# Altium schematic symbol library AD_Lib.SchLib: 1239 symbols (part 7 of 9) (continued)
## R0805_5.11K/150V@2
designator R?, comment 5.11k¦¸,0.125W
ÌùÆ¬µç×è; Manufacturer: Panasonic; pro-environment: RoHS; Quality: -55~155¡æ; other: 5.11k¦¸,0.125W,1%,150V; OPN: ERJ-6ENF5111V; PadsNum: 2; SN: SN; Category: µç×è; Part: ERJ-6ENF5111V; Value: 5.11k¦¸,0.125W; Price: ?; OPN_JLC: OPN_JLC; SN_JLC: SN_JLC; Price_JLC: 0
footprint R0805 (ÌùÆ¬µç×è£¬¹¦ÂÊ1/8W)
pins: 1, 2

## R0805_6.8K/150V
designator R?, comment 6.8k¦¸,0.125W
ÌùÆ¬µç×è; Manufacturer: KOA; pro-environment: RoHS; Quality: -55~155¡æ; other: 6.8k¦¸,0.125W,1%,150V; OPN: RK73H2ATTD6801F; PadsNum: 2; SN: SN; Category: µç×è; Part: RK73H2ATTD6801F; Value: 6.8k¦¸,0.125W; Price: ?; OPN_JLC: 0805W8F6801T5E; SN_JLC: C17772; Price_JLC: 0
footprint R0805 (ÌùÆ¬µç×è£¬¹¦ÂÊ1/8W)
pins: 1, 2

## R0805_7.5K/150V
designator R?, comment 7.5k¦¸,0.125W
ÌùÆ¬µç×è; Manufacturer: KOA; pro-environment: RoHS; Quality: -55~155¡æ; other: 7.5k¦¸,0.25W,1%,150V; OPN: RK73H2ATTD7501F; PadsNum: 2; SN: SN; Category: µç×è; Part: RK73H2ATTD7501F; Value: 7.5k¦¸,0.125W; QTY: 5000; Price: 0.04212; OPN_JLC: 0805W8F7501T5E; SN_JLC: C17807; Price_JLC: 0
footprint R0805 (ÌùÆ¬µç×è£¬¹¦ÂÊ1/8W)
pins: 1, 2

## R0805_8.2K/150V
designator R?, comment 8.2k¦¸,0.125W
ÌùÆ¬µç×è; Manufacturer: KOA; pro-environment: RoHS; Quality: -55~155¡æ; other: 8.2k¦¸,0.125W,1%,150V; OPN: RK73H2ATTD8201F; PadsNum: 2; SN: SN; Category: µç×è; Part: RK73H2ATTD8201F; Value: 8.2k¦¸,0.125W; QTY: 5000; Price: ?; OPN_JLC: 0805W8F8201T5E; SN_JLC: C17828; Price_JLC: 0
footprint R0805 (ÌùÆ¬µç×è£¬¹¦ÂÊ1/8W)
pins: 1, 2

## R0805_10/150V
designator R?, comment 10¦¸,0.125W
ÌùÆ¬µç×è; Manufacturer: KOA; pro-environment: RoHS; Quality: -55~155¡æ; SN: 03.4.38.11.17010001S; other: 10¦¸,0.125W,1%,150V; OPN: RK73H2ATTD10R0F; PadsNum: 2; Category: µç×è; Part: RK73H2ATTD10R0F; Value: 10¦¸,0.125W; QTY: 5000; Price: 0.03393; OPN_JLC: 0805W8F100JT5E; SN_JLC: C17415; Price_JLC: 0
footprint R0805 (ÌùÆ¬µç×è£¬¹¦ÂÊ1/8W)
pins: 1, 2

## R0805_10K/150V
designator R?, comment 10k¦¸,0.125W
ÌùÆ¬µç×è; Manufacturer: KOA; pro-environment: RoHS; Quality: -55~155¡æ; other: 10k¦¸,0.125W,1%,150V; OPN: RK73H2ATTD1002F; PadsNum: 2; SN: SN; Category: µç×è; Part: RK73H2ATTD1002F; Value: 10k¦¸,0.125W; Price: ?; OPN_JLC: 0805W8F1002T5E; SN_JLC: C17414; Price_JLC: 0
footprint R0805 (ÌùÆ¬µç×è£¬¹¦ÂÊ1/8W)
pins: 1, 2

## R0805_10K/150V@2
designator R?, comment 10k¦¸,0.125W
ÌùÆ¬µç×è; Manufacturer: Panasonic; pro-environment: RoHS; Quality: -55~155¡æ; other: 10k¦¸,0.125W,1%,150V; OPN: ERJ-6ENF1002V; PadsNum: 2; SN: SN; Category: µç×è; Part: ERJ-6ENF1002V; Value: 10k¦¸,0.125W; Price: ?; OPN_JLC: 0805W8F1002T5E; SN_JLC: C17414; Price_JLC: 0
footprint R0805 (ÌùÆ¬µç×è£¬¹¦ÂÊ1/8W)
pins: 1, 2

## R0805_12.7k/150V@3
designator R?, comment 12.7k¦¸,0.125W
ÌùÆ¬µç×è; Manufacturer: Viking; pro-environment: RoHS; Quality: -55~155¡æ; other: 12.7k¦¸,0.125W,1%,150V; OPN: ARG05FTC1272N; PadsNum: 2; SN: SN; Category: µç×è; Part: ARG05FTC1272N; Value: 12.7k¦¸,0.125W; QTY: 5000; Price: 0.035102; OPN_JLC: ARG05FTC1272N; SN_JLC: C217802; Price_JLC: 0.035102
footprint R0805 (ÌùÆ¬µç×è£¬¹¦ÂÊ1/8W)
pins: 1, 2

## R0805_12K/150V
designator R?, comment 12k¦¸,0.125W
ÌùÆ¬µç×è; Manufacturer: KOA; pro-environment: RoHS; Quality: -55~155¡æ; SN: 03.4.38.11.17012301S; other: 12K¦¸,0.125W,1%,150V; OPN: RK73H2ATTD1202F; PadsNum: 2; Category: µç×è; Part: RK73H2ATTD1202F; Value: 12k¦¸,0.125W; QTY: 5000; Price: 0.03393; OPN_JLC: 0805W8F1202T5E; SN_JLC: C17444; Price_JLC: 0
footprint R0805 (ÌùÆ¬µç×è£¬¹¦ÂÊ1/8W)
pins: 1, 2

## R0805_13.7/150V
designator R?, comment 13.7¦¸,0.125W
ÌùÆ¬µç×è; Manufacturer: KOA; pro-environment: RoHS; Quality: -55~155¡æ; other: 13.7¦¸,0.125W,1%,150V; OPN: RK73H2ARTTD13R7F; PadsNum: 2; SN: SN; Category: µç×è; Part: RK73H2ARTTD13R7F; Value: 13.7¦¸,0.125W; QTY: 5000; Price: 0.32526; OPN_JLC: OPN_JLC; SN_JLC: SN_JLC; Price_JLC: 0
footprint R0805 (ÌùÆ¬µç×è£¬¹¦ÂÊ1/8W)
pins: 1, 2

## R0805_13.7/150V@2
designator R?, comment 13.7¦¸,0.125W
ÌùÆ¬µç×è; Manufacturer: Panasonic; pro-environment: RoHS; Quality: -55~155¡æ; other: 13.7¦¸,0.125W,1%,150V; OPN: ERJ-6ENF13R7V; PadsNum: 2; SN: SN; Category: µç×è; Part: ERJ-6ENF13R7V; Value: 13.7¦¸,0.125W; Price: ?; OPN_JLC: OPN_JLC; SN_JLC: SN_JLC; Price_JLC: 0
footprint R0805 (ÌùÆ¬µç×è£¬¹¦ÂÊ1/8W)
pins: 1, 2

## R0805_15K/150V
designator R?, comment 15k¦¸,0.125W
ÌùÆ¬µç×è; Manufacturer: KOA; pro-environment: RoHS; Quality: -55~155¡æ; other: 15k¦¸,0.125W,1%,150V; OPN: RK73H2ATTD1502F; PadsNum: 2; SN: SN; Category: µç×è; Part: RK73H2ATTD1502F; Value: 15k¦¸,0.125W; QTY: 5000; Price: ?; OPN_JLC: 0805W8F1502T5E; SN_JLC: C17475; Price_JLC: 0
footprint R0805 (ÌùÆ¬µç×è£¬¹¦ÂÊ1/8W)
pins: 1, 2

## R0805_18K/150V
designator R?, comment 18k¦¸,0.125W
ÌùÆ¬µç×è; Manufacturer: KOA; pro-environment: RoHS; Quality: -55~155¡æ; other: 18k¦¸,0.125W,1%,150V; OPN: RK73H2ATTD1802F; PadsNum: 2; SN: SN; Category: µç×è; Part: RK73H2ATTD1802F; Value: 18k¦¸,0.125W; QTY: 5000; Price: ?; OPN_JLC: 0805W8F1802T5E; SN_JLC: C17506; Price_JLC: 0
footprint R0805 (ÌùÆ¬µç×è£¬¹¦ÂÊ1/8W)
pins: 1, 2

## R0805_20K/150V
designator R?, comment 20k¦¸,0.125W
ÌùÆ¬µç×è; Manufacturer: KOA; pro-environment: RoHS; Quality: -55~155¡æ; other: 20k¦¸,0.125W,1%,150V; OPN: RK73H2ATTD2002F; PadsNum: 2; SN: SN; Category: µç×è; Part: RK73H2ATTD2002F; Value: 20k¦¸,0.125W; Price: ?; OPN_JLC: 0805W8F2002T5E; SN_JLC: C4328; Price_JLC: 0
footprint R0805 (ÌùÆ¬µç×è£¬¹¦ÂÊ1/8W)
pins: 1, 2

## R0805_20K/150V@2
designator R?, comment 20k¦¸,0.125W
ÌùÆ¬µç×è; Manufacturer: Panasonic; pro-environment: RoHS; Quality: -55~155¡æ; other: 20k¦¸,0.125W,1%,150V; OPN: ERJ-6ENF2002V; PadsNum: 2; SN: SN; Category: µç×è; Part: ERJ-6ENF2002V; Value: 20k¦¸,0.125W; Price: ?; OPN_JLC: 0805W8F2002T5E; SN_JLC: C4328; Price_JLC: 0
footprint R0805 (ÌùÆ¬µç×è£¬¹¦ÂÊ1/8W)
pins: 1, 2

## R0805_22/150V
designator R?, comment 22¦¸,0.125W
ÌùÆ¬µç×è; Manufacturer: KOA; pro-environment: RoHS; Quality: -55~155¡æ; SN: 03.4.38.11.17022002S; other: 22¦¸,0.125W,1%,150V; OPN: RK73H2ATTD22R0F; PadsNum: 2; Category: µç×è; Part: RK73H2ATTD22R0F; Value: 22¦¸,0.125W; QTY: 5000; Price: 0.03276; OPN_JLC: 0805W8F220JT5E; SN_JLC: C17561; Price_JLC: 0
footprint R0805 (ÌùÆ¬µç×è£¬¹¦ÂÊ1/8W)
pins: 1, 2

## R0805_22K/150V
designator R?, comment 22k¦¸,0.125W
ÌùÆ¬µç×è; Manufacturer: KOA; pro-environment: RoHS; Quality: -55~155¡æ; SN: 03.4.38.11.17022301S; other: 22k¦¸,0.125W,1%,150V; OPN: RK73H2ATTD2202F; PadsNum: 2; Category: µç×è; Part: RK73H2ATTD2202F; Value: 22k¦¸,0.125W; QTY: 5000; Price: 0.03276; OPN_JLC: 0805W8F2202T5E; SN_JLC: C17560; Price_JLC: 0
footprint R0805 (ÌùÆ¬µç×è£¬¹¦ÂÊ1/8W)
pins: 1, 2

## R0805_24K/150V
designator R?, comment 24k¦¸,0.125W
ÌùÆ¬µç×è; Manufacturer: KOA; pro-environment: RoHS; Quality: -55~155¡æ; other: 24k¦¸,0.125W,1%,150V; OPN: RK73H2ATTD2402F; PadsNum: 2; SN: SN; Category: µç×è; Part: RK73H2ATTD2402F; Value: 24k¦¸,0.125W; QTY: 5000; Price: ?; OPN_JLC: 0805W8F2402T5E; SN_JLC: C17575; Price_JLC: 0
footprint R0805 (ÌùÆ¬µç×è£¬¹¦ÂÊ1/8W)
pins: 1, 2

## R0805_27.4/150V
designator R?, comment 27.4¦¸,0.125W
ÌùÆ¬µç×è; Manufacturer: KOA; pro-environment: RoHS; Quality: -55~155¡æ; other: 27.4¦¸,0.125W,1%,150V; OPN: RK73H2ATTD27R4F; PadsNum: 2; SN: SN; Category: µç×è; Part: RK73H2ATTD27R4F; Value: 27.4¦¸,0.125W; QTY: 5000; Price: 0.03042; OPN_JLC: OPN_JLC; SN_JLC: SN_JLC; Price_JLC: 0
footprint R0805 (ÌùÆ¬µç×è£¬¹¦ÂÊ1/8W)
pins: 1, 2

## R0805_30.1K/150V
designator R?, comment 30.1k¦¸,0.125W
ÌùÆ¬µç×è; Manufacturer: KOA; pro-environment: RoHS; Quality: -55~155¡æ; SN: 03.4.38.11.17030301S; other: 30.1k¦¸,0.125W,1%,150V; OPN: RK73H2ATTD3012F; PadsNum: 2; Category: µç×è; Part: RK73H2ATTD3012F; Value: 30.1k¦¸,0.125W; Price: ?; OPN_JLC: OPN_JLC; SN_JLC: SN_JLC; Price_JLC: 0
footprint R0805 (ÌùÆ¬µç×è£¬¹¦ÂÊ1/8W)
pins: 1, 2

## R0805_30K/150V
designator R?, comment 30k¦¸,0.125W
ÌùÆ¬µç×è; Manufacturer: KOA; pro-environment: RoHS; Quality: -55~155¡æ; other: 30k¦¸,0.125W,1%,150V; OPN: RK73H2ATTD3002F; PadsNum: 2; SN: SN; Category: µç×è; Part: RK73H2ATTD3002F; Value: 30k¦¸,0.125W; QTY: 5000; Price: 0.03393; OPN_JLC: 0805W8F3303T5E; SN_JLC: C17629; Price_JLC: 0
footprint R0805 (ÌùÆ¬µç×è£¬¹¦ÂÊ1/8W)
pins: 1, 2

## R0805_33/150V
designator R?, comment 33¦¸,0.125W
ÌùÆ¬µç×è; Manufacturer: KOA; pro-environment: RoHS; Quality: -55~155¡æ; other: 33¦¸,0.125W,1%,150V; OPN: RK73H2ATTD33R0F; PadsNum: 2; SN: SN; Category: µç×è; Part: RK73H2ATTD33R0F; Value: 33¦¸,0.125W; QTY: 5000; Price: 0.03842; OPN_JLC: OPN_JLC; SN_JLC: SN_JLC; Price_JLC: 0
footprint R0805 (ÌùÆ¬µç×è£¬¹¦ÂÊ1/8W)
pins: 1, 2

## R0805_33K/150V
designator R?, comment 33k¦¸,0.125W
ÌùÆ¬µç×è; Manufacturer: KOA; pro-environment: RoHS; Quality: -55~155¡æ; other: 33k¦¸,0.125W,1%,150V; OPN: RK73H2ATTD3302F; PadsNum: 2; SN: SN; Category: µç×è; Part: RK73H2ATTD3302F; Value: 33k¦¸,0.125W; QTY: 5000; Price: 0.04212; OPN_JLC: 0805W8F3302T5E; SN_JLC: C17633; Price_JLC: 0
footprint R0805 (ÌùÆ¬µç×è£¬¹¦ÂÊ1/8W)
pins: 1, 2

## R0805_36.5K/150V@3
designator R?, comment 36.5k¦¸,0.125W
ÌùÆ¬µç×è; Manufacturer: Yageo; pro-environment: RoHS; Quality: -55~155¡æ; SN: 03.4.38.11.17036303S; other: 36.5k¦¸,0.125W,1%,150V; OPN: RC0805FR-0736K5L; PadsNum: 2; Category: µç×è; Part: RC0805FR-0736K5L; Value: 36.5k¦¸,0.125W; QTY: 5000; Price: 0.0234; OPN_JLC: OPN_JLC; SN_JLC: SN_JLC; Price_JLC: 0
footprint R0805 (ÌùÆ¬µç×è£¬¹¦ÂÊ1/8W)
pins: 1, 2

## R0805_37.4/150V
designator R?, comment 37.4¦¸,0.125W
ÌùÆ¬µç×è; Manufacturer: KOA; pro-environment: RoHS; Quality: -55~155¡æ; other: 37.4¦¸,0.125W,1%,150V; OPN: RK73H2ATTD37R4F; PadsNum: 2; SN: SN; Category: µç×è; Part: RK73H2ATTD37R4F; Value: 37.4¦¸,0.125W; QTY: 5000; Price: 0.03042; OPN_JLC: OPN_JLC; SN_JLC: SN_JLC; Price_JLC: 0
footprint R0805 (ÌùÆ¬µç×è£¬¹¦ÂÊ1/8W)
pins: 1, 2

## R0805_39K/150V
designator R?, comment 39k¦¸,0.125W
ÌùÆ¬µç×è; Manufacturer: Yageo; pro-environment: RoHS; Quality: -55~155¡æ; SN: 03.4.38.11.17039305S; other: 39k¦¸,0.125W,1%,150V; OPN: RC0805JR-0739KL; PadsNum: 2; Category: µç×è; Part: RC0805JR-0739KL; Value: 39k¦¸,0.125W; QTY: 5000; Price: 0.02457; OPN_JLC: 0805W8F3902T5E; SN_JLC: C25826; Price_JLC: 0
footprint R0805 (ÌùÆ¬µç×è£¬¹¦ÂÊ1/8W)
pins: 1, 2

## R0805_47/150V@3
designator R?, comment 47¦¸,0.125W
ÌùÆ¬µç×è; Manufacturer: Yageo; pro-environment: RoHS; Quality: -55~155¡æ; SN: 03.4.38.11.17047002S; other: 47¦¸,0.125W,1%,150V; OPN: RC0805FR-0747RL; PadsNum: 2; Category: µç×è; Part: RC0805FR-0747RL; Value: 47¦¸,0.125W; QTY: 5000; Price: 0.02457; OPN_JLC: 0805W8F470JT5E; SN_JLC: C17714; Price_JLC: 0
footprint R0805 (ÌùÆ¬µç×è£¬¹¦ÂÊ1/8W)
pins: 1, 2

## R0805_56K/150V
designator R?, comment 56k¦¸,0.125W
ÌùÆ¬µç×è; Manufacturer: KOA; pro-environment: RoHS; Quality: -55~155¡æ; SN: 03.4.38.11.17056301S; other: 56k¦¸,0.125W,1%,150V; OPN: RK73H2ATTD5602F; PadsNum: 2; Category: µç×è; Part: RK73H2ATTD5602F; Value: 56k¦¸,0.125W; QTY: 5000; Price: 0.04212; OPN_JLC: 0805W8F5602T5E; SN_JLC: C17756; Price_JLC: 0
footprint R0805 (ÌùÆ¬µç×è£¬¹¦ÂÊ1/8W)
pins: 1, 2

## R0805_59k/150V@3
designator R?, comment 59k¦¸,0.125W
ÌùÆ¬µç×è; Manufacturer: Viking; pro-environment: RoHS; Quality: -55~155¡æ; other: 59k¦¸,0.125W,1%,150V; OPN: ARG05FTC5902N; PadsNum: 2; SN: SN; Category: µç×è; Part: ARG05FTC5902N; Value: 59k¦¸,0.125W; QTY: 5000; Price: 0.060403; OPN_JLC: ARG05FTC5902N; SN_JLC: C218545; Price_JLC: 0.060403
footprint R0805 (ÌùÆ¬µç×è£¬¹¦ÂÊ1/8W)
pins: 1, 2

## R0805_63.4K/150V
designator R?, comment 63.4k¦¸,0.125W
ÌùÆ¬µç×è; Manufacturer: KOA; pro-environment: RoHS; Quality: -55~155¡æ; other: 63.4k¦¸,0.125W,1%,150V; OPN: RK73H1JTTD6342F; PadsNum: 2; SN: SN; Category: µç×è; Part: RK73H1JTTD6342F; Value: 63.4k¦¸,0.125W; QTY: 5000; Price: 0.01582; OPN_JLC: ARG05FTC6342N; SN_JLC: C218655; Price_JLC: 0.035102
footprint R0805 (ÌùÆ¬µç×è£¬¹¦ÂÊ1/8W)
pins: 1, 2

## R0805_100/150V
designator R?, comment 100¦¸,0.125W
ÌùÆ¬µç×è; Manufacturer: KOA; pro-environment: RoHS; Quality: -55~155¡æ; other: 100¦¸,0.125W,1%,150V; OPN: RK73H2ATTD1000F; PadsNum: 2; SN: SN; Category: µç×è; Part: RK73H2ATTD1000F; Value: 100¦¸,0.125W; QTY: 5000; Price: 0.03042; OPN_JLC: 0805W8F1000T5E; SN_JLC: C17408; Price_JLC: 0
footprint R0805 (ÌùÆ¬µç×è£¬¹¦ÂÊ1/8W)
pins: 1, 2

## R0805_100K/150V
designator R?, comment 100k¦¸,0.125W
ÌùÆ¬µç×è; Manufacturer: KOA; pro-environment: RoHS; Quality: -55~155¡æ; other: 100k¦¸,0.125W,1%,150V; OPN: RK73H2ATTD1003F; PadsNum: 2; SN: SN; Category: µç×è; Part: RK73H2ATTD1003F; Value: 100k¦¸,0.125W; QTY: 5000; Price: 0.04212; OPN_JLC: 0805W8F1003T5E; SN_JLC: C17407; Price_JLC: 0
footprint R0805 (ÌùÆ¬µç×è£¬¹¦ÂÊ1/8W)
pins: 1, 2

## R0805_100K/150V@2
designator R?, comment 100k¦¸,0.125W
ÌùÆ¬µç×è; Manufacturer: Panasonic; pro-environment: RoHS; Quality: -55~155¡æ; other: 100k¦¸,0.125W,1%,150V; OPN: ERJ-6ENF1003V; PadsNum: 2; SN: SN; Category: µç×è; Part: ERJ-6ENF1003V; Value: 100k¦¸,0.125W; Price: ?; OPN_JLC: 0805W8F1003T5E; SN_JLC: C17407; Price_JLC: 0
footprint R0805 (ÌùÆ¬µç×è£¬¹¦ÂÊ1/8W)
pins: 1, 2

## R0805_113K/150V@3
designator R?, comment 113k¦¸,0.125W
ÌùÆ¬µç×è; Manufacturer: Viking; pro-environment: RoHS; Quality: -55~155¡æ; other: 113k¦¸,0.125W,1%,150V; OPN: ARG05FTC1133N; PadsNum: 2; SN: SN; Category: µç×è; Part: ARG05FTC1133N; Value: 113k¦¸,0.125W; QTY: 5000; Price: 0.040994; OPN_JLC: ARG05FTC1133N; SN_JLC: C217780; Price_JLC: 0.040994
footprint R0805 (ÌùÆ¬µç×è£¬¹¦ÂÊ1/8W)
pins: 1, 2

## R0805_120/150V
designator R?, comment 120¦¸,0.125W
ÌùÆ¬µç×è; Manufacturer: KOA; pro-environment: RoHS; Quality: -55~155¡æ; other: 120¦¸,0.125W,1%,150V; OPN: RK73H2ATTD1200F; PadsNum: 2; SN: SN; Category: µç×è; Part: RK73H2ATTD1200F; Value: 120¦¸,0.125W; QTY: 5000; Price: 0.03276; OPN_JLC: 0805W8F1200T5E; SN_JLC: C17437; Price_JLC: 0
footprint R0805 (ÌùÆ¬µç×è£¬¹¦ÂÊ1/8W)
pins: 1, 2

## R0805_120K/100V/0.1%/25ppm
designator R?, comment 120k¦¸,0.125W
¾«ÃÜµç×è; 0.1%; 25ppm; Manufacturer: KOA; pro-environment: RoHS; Quality: -55~155¡æ; other: 120k¦¸,0.125W,0.1%,100V,25ppm; OPN: RN73H2ATTD1203B25; PadsNum: 2; SN: SN; Category: µç×è; Part: RN73H2ATTD1203B25; Value: 120k¦¸,0.125W; QTY: 5000; Price: 0.83187; OPN_JLC: 0805W8F1203T5E; SN_JLC: C17436; Price_JLC: 0
footprint R0805 (ÌùÆ¬µç×è£¬¹¦ÂÊ1/8W)
pins: 1, 2

## R0805_130K/150V
designator R?, comment 130k¦¸,0.125W
ÌùÆ¬µç×è; Manufacturer: KOA; pro-environment: RoHS; Quality: -55~155¡æ; SN: 03.4.38.11.17013401S; other: 130k¦¸,0.125W,1%,150V; OPN: RK73H2ATTD1303F; PadsNum: 2; Category: µç×è; Part: RK73H2ATTD1303F; Value: 130k¦¸,0.125W; QTY: 5000; Price: 0.04212; OPN_JLC: OPN_JLC; SN_JLC: SN_JLC; Price_JLC: 0
footprint R0805 (ÌùÆ¬µç×è£¬¹¦ÂÊ1/8W)
pins: 1, 2

## R0805_150/150V
designator R?, comment 150¦¸,0.125W
ÌùÆ¬µç×è; Manufacturer: KOA; pro-environment: RoHS; Quality: -55~155¡æ; other: 150¦¸,0.125W,1%,150V; OPN: RK73H2ATTD1500F; PadsNum: 2; SN: SN; Category: µç×è; Part: RK73H2ATTD1500F; Value: 150¦¸,0.125W; QTY: 5000; Price: 0.03276; OPN_JLC: 0805W8F1500T5E; SN_JLC: C17471; Price_JLC: 0
footprint R0805 (ÌùÆ¬µç×è£¬¹¦ÂÊ1/8W)
pins: 1, 2

## R0805_160K/150V
designator R?, comment 160k¦¸,0.125W
ÌùÆ¬µç×è; Manufacturer: KOA; pro-environment: RoHS; Quality: -55~155¡æ; SN: 03.4.38.11.17016401S; other: 160k¦¸,0.125W,1%,150V; OPN: RK73H2ATTD1603F; PadsNum: 2; Category: µç×è; Part: RK73H2ATTD1603F; Value: 160k¦¸,0.125W; QTY: 5000; Price: 0.04212; OPN_JLC: OPN_JLC; SN_JLC: SN_JLC; Price_JLC: 0
footprint R0805 (ÌùÆ¬µç×è£¬¹¦ÂÊ1/8W)
pins: 1, 2

## R0805_169/150V
designator R?, comment 169¦¸,0.125W
ÌùÆ¬µç×è; Manufacturer: KOA; pro-environment: RoHS; Quality: -55~155¡æ; other: 169¦¸,0.125W,1%,150V; OPN: RK73H2ATTD1690F; PadsNum: 2; SN: SN; Category: µç×è; Part: RK73H2ATTD1690F; Value: 169¦¸,0.125W; QTY: 5000; Price: 0.03042; OPN_JLC: OPN_JLC; SN_JLC: SN_JLC; Price_JLC: 0
footprint R0805 (ÌùÆ¬µç×è£¬¹¦ÂÊ1/8W)
pins: 1, 2

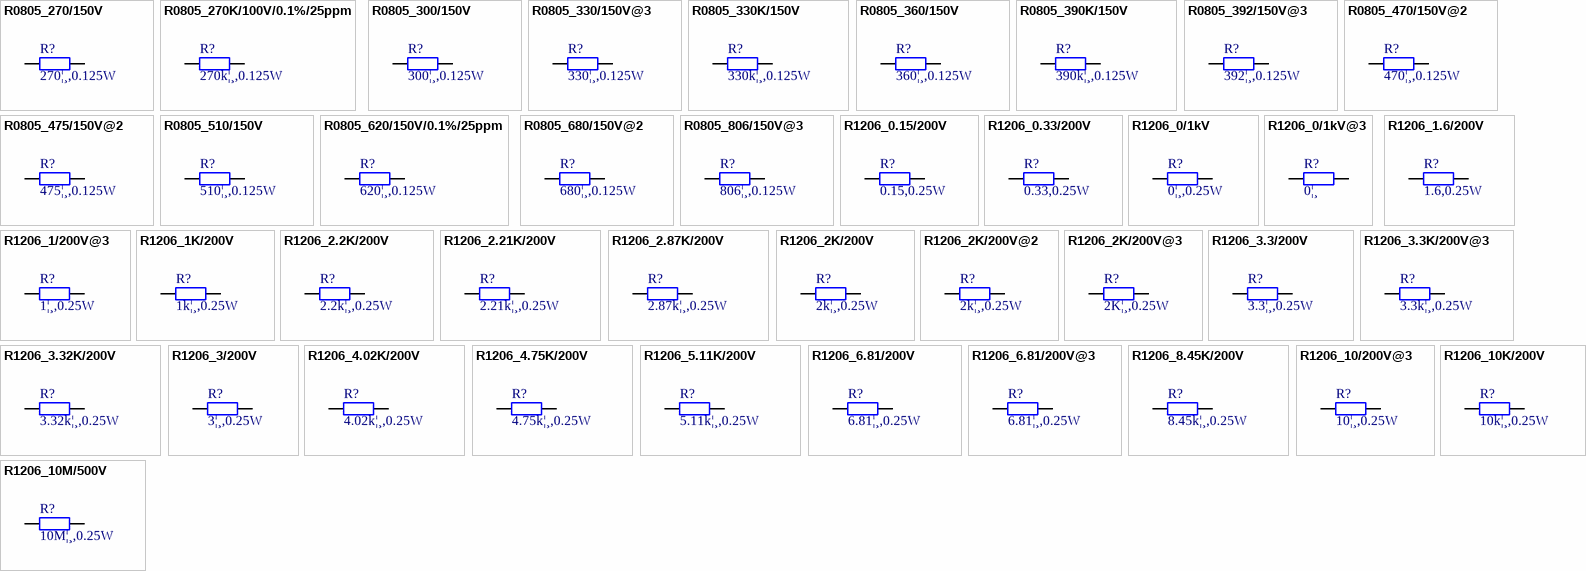
[diagram p33: symbols R0805_270/150V to R1206_10M/500V]

## R0805_270/150V
designator R?, comment 270¦¸,0.125W
ÌùÆ¬µç×è; Manufacturer: KOA; pro-environment: RoHS; Quality: -55~155¡æ; other: 270¦¸,0.125W,1%,150V; OPN: RK73H2ATTD2700F; PadsNum: 2; SN: SN; Category: µç×è; Part: RK73H2ATTD2700F; Value: 270¦¸,0.125W; QTY: 5000; Price: 0.03042; OPN_JLC: 0805W8F2700T5E; SN_JLC: C17590; Price_JLC: 0
footprint R0805 (ÌùÆ¬µç×è£¬¹¦ÂÊ1/8W)
pins: 1, 2

## R0805_270K/100V/0.1%/25ppm
designator R?, comment 270k¦¸,0.125W
¾«ÃÜµç×è£¬0.1%£¬25ppm; Manufacturer: KOA; pro-environment: RoHS; Quality: -55~155¡æ; other: 270k¦¸,0.125W,0.1%,100V,25ppm; OPN: RN73H2ATTD2703B25; PadsNum: 2; SN: SN; Category: µç×è; Part: RN73H2ATTD2703B25; Value: 270k¦¸,0.125W; QTY: 5000; Price: 0.83187; OPN_JLC: 0805W8F2703T5E; SN_JLC: C17589; Price_JLC: 0
footprint R0805 (ÌùÆ¬µç×è£¬¹¦ÂÊ1/8W)
pins: 1, 2

## R0805_300/150V
designator R?, comment 300¦¸,0.125W
ÌùÆ¬µç×è; Manufacturer: KOA; pro-environment: RoHS; Quality: -55~155¡æ; other: 300¦¸,0.125W,1%,150V; OPN: RK73H2ATTD3000F; PadsNum: 2; SN: SN; Category: µç×è; Part: RK73H2ATTD3000F; Value: 300¦¸,0.125W; QTY: 5000; Price: 0.03393; OPN_JLC: 0805W8F3000T5E; SN_JLC: C17617; Price_JLC: 0
footprint R0805 (ÌùÆ¬µç×è£¬¹¦ÂÊ1/8W)
pins: 1, 2

## R0805_330/150V@3
designator R?, comment 330¦¸,0.125W
ÌùÆ¬µç×è; Manufacturer: Yageo; pro-environment: RoHS; Quality: -55~155¡æ; SN: 03.4.38.11.17033101S; other: 330¦¸,0.125W,5%,150V; OPN: RC0805JR-07330RL; PadsNum: 2; Category: µç×è; Part: RC0805JR-07330RL; Value: 330¦¸,0.125W; QTY: 5000; Price: 0.02457; OPN_JLC: 0805W8F3300T5E; SN_JLC: C17630; Price_JLC: 0
footprint R0805 (ÌùÆ¬µç×è£¬¹¦ÂÊ1/8W)
pins: 1, 2

## R0805_330K/150V
designator R?, comment 330k¦¸,0.125W
ÌùÆ¬µç×è; Manufacturer: KOA; pro-environment: RoHS; Quality: -55~155¡æ; other: 330k¦¸,0.125W,1%,150V; OPN: RK73H2ATTD3303F; PadsNum: 2; SN: SN; Category: µç×è; Part: RK73H2ATTD3303F; Value: 330k¦¸,0.125W; QTY: 5000; Price: 0.04212; OPN_JLC: 0805W8F3303T5E; SN_JLC: C17629; Price_JLC: 0
footprint R0805 (ÌùÆ¬µç×è£¬¹¦ÂÊ1/8W)
pins: 1, 2

## R0805_360/150V
designator R?, comment 360¦¸,0.125W
ÌùÆ¬µç×è; Manufacturer: KOA; pro-environment: RoHS; Quality: -55~155¡æ; other: 360¦¸,0.125W,1%,150V; OPN: RK73H2ATTD3600F; PadsNum: 2; SN: SN; Category: µç×è; Part: RK73H2ATTD3600F; Value: 360¦¸,0.125W; QTY: 5000; Price: 0.03042; OPN_JLC: OPN_JLC; SN_JLC: SN_JLC; Price_JLC: 0
footprint R0805 (ÌùÆ¬µç×è£¬¹¦ÂÊ1/8W)
pins: 1, 2

## R0805_390K/150V
designator R?, comment 390k¦¸,0.125W
ÌùÆ¬µç×è; Manufacturer: KOA; pro-environment: RoHS; Quality: -55~155¡æ; other: 390k¦¸,0.125W,1%,150V; OPN: RK73H2ATTD3903F; PadsNum: 2; SN: SN; Category: µç×è; Part: RK73H2ATTD3903F; Value: 390k¦¸,0.125W; QTY: 5000; Price: ?; OPN_JLC: 0805W8F3903T5E; SN_JLC: C17656; Price_JLC: 0
footprint R0805 (ÌùÆ¬µç×è£¬¹¦ÂÊ1/8W)
pins: 1, 2

## R0805_392/150V@3
designator R?, comment 392¦¸,0.125W
ÌùÆ¬µç×è; Manufacturer: Viking; pro-environment: RoHS; Quality: -55~155¡æ; other: 392¦¸,0.125W,1%,150V; OPN: ARG05FTC3920; PadsNum: 2; SN: SN; Category: µç×è; Part: ARG05FTC3920; Value: 392¦¸,0.125W; QTY: 5000; Price: 0.051102; OPN_JLC: ARG05FTC3920; SN_JLC: C218545; Price_JLC: 0.051102
footprint R0805 (ÌùÆ¬µç×è£¬¹¦ÂÊ1/8W)
pins: 1, 2

## R0805_470/150V@2
designator R?, comment 470¦¸,0.125W
ÌùÆ¬µç×è; Manufacturer: Panasonic; pro-environment: RoHS; Quality: -55~155¡æ; other: 470¦¸,0.125W,5%,150V; OPN: ERJ6GEYJ471V; PadsNum: 2; SN: SN; Category: µç×è; Part: ERJ6GEYJ471V; Value: 470¦¸,0.125W; QTY: 5000; Price: 0.0234; OPN_JLC: 0805W8F4700T5E; SN_JLC: C17710; Price_JLC: 0
footprint R0805 (ÌùÆ¬µç×è£¬¹¦ÂÊ1/8W)
pins: 1, 2

## R0805_475/150V@2
designator R?, comment 475¦¸,0.125W
ÌùÆ¬µç×è; Manufacturer: Panasonic; pro-environment: RoHS; Quality: -55~155¡æ; other: 475¦¸,0.125W,1%,150V; OPN: ERJ-6ENF4750V; PadsNum: 2; SN: SN; Category: µç×è; Part: ERJ-6ENF4750V; Value: 475¦¸,0.125W; Price: ?; OPN_JLC: OPN_JLC; SN_JLC: SN_JLC; Price_JLC: 0
footprint R0805 (ÌùÆ¬µç×è£¬¹¦ÂÊ1/8W)
pins: 1, 2

## R0805_510/150V
designator R?, comment 510¦¸,0.125W
ÌùÆ¬µç×è; Manufacturer: KOA; pro-environment: RoHS; Quality: -55~155¡æ; SN: 03.4.38.11.17051101S; other: 510¦¸,0.125W,1%,150V; OPN: RK73H2ATTD5100F; PadsNum: 2; Category: µç×è; Part: RK73H2ATTD5100F; Value: 510¦¸,0.125W; QTY: 5000; Price: 0.03393; OPN_JLC: 0805W8F5100T5E; SN_JLC: C1773; Price_JLC: 0
footprint R0805 (ÌùÆ¬µç×è£¬¹¦ÂÊ1/8W)
pins: 1, 2

## R0805_620/150V/0.1%/25ppm
designator R?, comment 620¦¸,0.125W
¾«ÃÜµç×è; 0.1%; 25ppm; Manufacturer: KOA; pro-environment: RoHS; Quality: -55~155¡æ; other: 620¦¸,0.125W,0.1%,150V; OPN: RN732ATTD6200B25; PadsNum: 2; SN: SN; Category: µç×è; Part: RN732ATTD6200B25; Value: 620¦¸,0.125W; QTY: 5000; Price: 1.6385; OPN_JLC: RN732ATTD6200B25; SN_JLC: C186471; Price_JLC: 0.7984
footprint R0805 (ÌùÆ¬µç×è£¬¹¦ÂÊ1/8W)
pins: 1, 2
